# Altium footprint library PcbLib1.PcbLib: 69 footprints (part 3 of 5)
Each footprint in its own frame and in the unit in brackets; x right, y up, seen from the top. Pads: shape width x height; smd on the part's side, far side on the other; paste and mask are expansions set on the pad; w line width, h text height; cw(c..) or ccw(c..) is an arc to the next point about the centre after c.
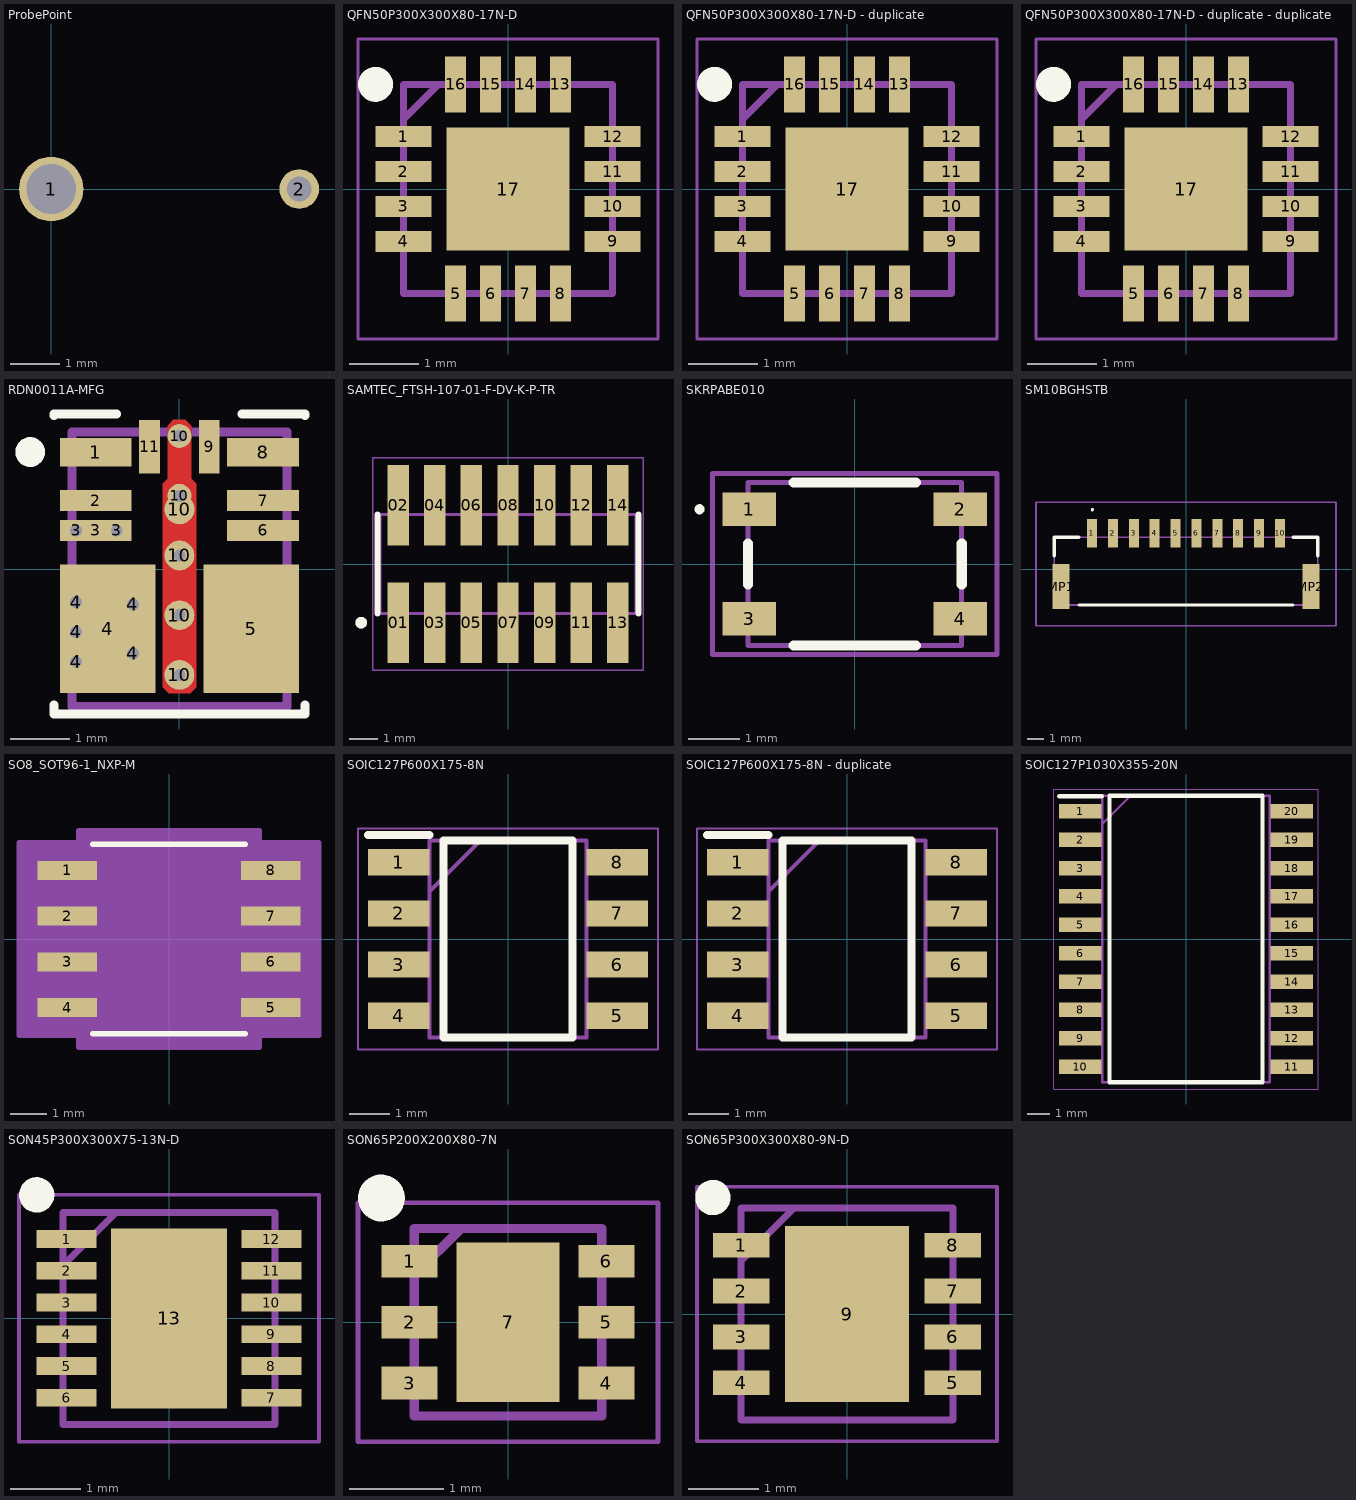
[diagram p2: the footprints below, top view; thin cyan lines are the x and y axes]

## PCBComponent_1 - duplicate - duplicate [mm]

## ProbePoint [mm]
pads (2):
  round 1.3 hole 1: 1(0,0)
  round 0.8 hole 0.5: 2(5,0)

## QFN50P300X300X80-17N-D [mm]
pads (17):
  rect 0.8x0.3 smd: 1(-1.5,0.75) 2(-1.5,0.25) 3(-1.5,-0.25) 4(-1.5,-0.75) 9(1.5,-0.75) 10(1.5,-0.25) 11(1.5,0.25) 12(1.5,0.75)
  rect 0.3x0.8 smd: 5(-0.75,-1.5) 6(-0.25,-1.5) 7(0.25,-1.5) 8(0.75,-1.5) 13(0.75,1.5) 14(0.25,1.5) 15(-0.25,1.5) 16(-0.75,1.5)
  rect 1.76x1.76 smd: 17(0,0)
Top Overlay:
  circle w0.25: c-1.9,1.5 r0.125
Mechanical 13:
  lines w0.1: -1.5,1 -1,1.5 ; -1.5,-1.5 1.5,-1.5 1.5,1.5 -1.5,1.5 -1.5,-1.5
Mechanical 15:
  lines w0.05: -2.15,-2.15 2.15,-2.15 2.15,2.15 -2.15,2.15 -2.15,-2.15
3D body "ADS7028IRTER.stp": height 0.8, standoff 0, extent -1.5,-1.5 1.5,1.5

## QFN50P300X300X80-17N-D - duplicate [mm]
pads (17):
  rect 0.8x0.3 smd: 1(-1.5,0.75) 2(-1.5,0.25) 3(-1.5,-0.25) 4(-1.5,-0.75) 9(1.5,-0.75) 10(1.5,-0.25) 11(1.5,0.25) 12(1.5,0.75)
  rect 0.3x0.8 smd: 5(-0.75,-1.5) 6(-0.25,-1.5) 7(0.25,-1.5) 8(0.75,-1.5) 13(0.75,1.5) 14(0.25,1.5) 15(-0.25,1.5) 16(-0.75,1.5)
  rect 1.76x1.76 smd mask+0.2: 17(0,0)
Top Overlay:
  circle w0.25: c-1.9,1.5 r0.125
Mechanical 13:
  lines w0.1: -1.5,1 -1,1.5 ; -1.5,-1.5 -1.5,1.5 1.5,1.5 1.5,-1.5 -1.5,-1.5
Mechanical 15:
  lines w0.05: -2.15,-2.15 -2.15,2.15 2.15,2.15 2.15,-2.15 -2.15,-2.15
3D body "ADS7138QRTERQ1.stp": height 0.8, standoff 0, extent -1.5,-1.5 1.5,1.5

## QFN50P300X300X80-17N-D - duplicate - duplicate [mm]
pads (17):
  rect 0.8x0.3 smd: 1(-1.5,0.75) 2(-1.5,0.25) 3(-1.5,-0.25) 4(-1.5,-0.75) 9(1.5,-0.75) 10(1.5,-0.25) 11(1.5,0.25) 12(1.5,0.75)
  rect 0.3x0.8 smd: 5(-0.75,-1.5) 6(-0.25,-1.5) 7(0.25,-1.5) 8(0.75,-1.5) 13(0.75,1.5) 14(0.25,1.5) 15(-0.25,1.5) 16(-0.75,1.5)
  rect 1.76x1.76 smd mask+0.2: 17(0,0)
Top Overlay:
  circle w0.25: c-1.9,1.5 r0.125
Mechanical 13:
  lines w0.1: -1.5,1 -1,1.5 ; -1.5,-1.5 1.5,-1.5 1.5,1.5 -1.5,1.5 -1.5,-1.5
Mechanical 15:
  lines w0.05: -2.15,-2.15 2.15,-2.15 2.15,2.15 -2.15,2.15 -2.15,-2.15
3D body "ADS7138QRTERQ1.stp": height 0.8, standoff 0, extent -1.5,-1.5 1.5,1.5

## RDN0011A-MFG [mm]
pads (24):
  rect 1.2x0.475 smd paste-0.587 mask-0.584: 1(-1.4,1.962) 8(1.4,1.962)
  rect 1.2x0.35 smd paste-0.587 mask-0.584: 2(-1.4,1.15) 3(-1.4,0.65) 6(1.4,0.65) 7(1.4,1.15)
  round 0.35 hole 0.2 paste-2539.97 mask-0.165: 3(-1.73,0.65) 3(-1.05,0.65)
  round 0.5 hole 0.2 paste-2539.97 mask-0.241: 4(-1.73,-1.55) 4(-1.73,-1.05) 4(-1.73,-0.55) 4(-0.78,-1.41) 4(-0.78,-0.59) 10(0,-1.77) 10(0,-0.77) 10(0,0.23)
  rect 1.6x2.15 smd paste-1.062 mask-1.067: 4(-1.2,-1) 5(1.2,-1)
  rect 0.35x0.9 smd paste-0.437 mask-0.432: 9(0.5,2.05) 11(-0.5,2.05)
  round 0.025 smd mask+0: 10(0,0.212)
  round 0.504 smd paste-0.239 mask-0.241: 10(0,1.005)
  round 0.4 hole 0.2 paste-2539.97 mask-0.191: 10(0,1.23) 10(0,2.23)
Top Layer:
  region: -0.2,1.515 -0.2,2.4 -0.1,2.5 0.1,2.5 0.2,2.4 0.2,1.515 0.24,1.475 0.28,1.435 0.28,-1.975 0.18,-2.075 -0.18,-2.075 -0.28,-1.975 -0.28,1.435 -0.24,1.475
Top Overlay:
  circle w0.25: c-2.5,1.962 r0.125
  lines w0.15: -2.1,-2.275 -2.1,-2.425 2.1,-2.425 2.1,-2.275 ; -2.1,2.575 -2.1,2.6 -1.05,2.6 ; 1.05,2.6 2.1,2.6 2.1,2.575
Top Paste:
  drawing of 23 lines, arcs and shapes, not listed
Top Solder:
  region: -0.15,0.974 -0.15,2.399 -0.1,2.449 0.1,2.449 0.15,2.399 0.15,0.974 0.1,0.924 -0.1,0.924
  region: -1.525,-2.025 -0.5,-2.025 -0.5,0.025 -1.525,0.025 -1.575,-0.025 -1.575,-0.125 -1.625,-0.175 -1.9,-0.175 -1.95,-0.225 -1.95,-0.375 -1.9,-0.425 -1.625,-0.425 -1.575,-0.475 -1.575,-0.625 -1.625,-0.675 -1.9,-0.675 -1.95,-0.725 -1.95,-0.875 -1.9,-0.925 -1.625,-0.925 -1.575,-0.975 -1.575,-1.125 -1.625,-1.175 -1.9,-1.175 -1.95,-1.225 -1.95,-1.375 -1.9,-1.425 -1.625,-1.425 -1.575,-1.475 -1.575,-1.625 -1.625,-1.675 -1.9,-1.675 -1.95,-1.725 -1.95,-1.875 -1.9,-1.925 -1.625,-1.925 -1.575,-1.975
  region: 1.525,-2.025 0.5,-2.025 0.5,0.025 1.525,0.025 1.575,-0.025 1.575,-0.125 1.625,-0.175 1.9,-0.175 1.95,-0.225 1.95,-0.375 1.9,-0.425 1.625,-0.425 1.575,-0.475 1.575,-0.625 1.625,-0.675 1.9,-0.675 1.95,-0.725 1.95,-0.875 1.9,-0.925 1.625,-0.925 1.575,-0.975 1.575,-1.125 1.625,-1.175 1.9,-1.175 1.95,-1.225 1.95,-1.375 1.9,-1.425 1.625,-1.425 1.575,-1.475 1.575,-1.625 1.625,-1.675 1.9,-1.675 1.95,-1.725 1.95,-1.875 1.9,-1.925 1.625,-1.925 1.575,-1.975
  region: -0.375,1.7 -0.425,1.65 -0.575,1.65 -0.625,1.7 -0.625,2.4 -0.575,2.45 -0.425,2.45 -0.375,2.4
  region: 0.625,1.7 0.575,1.65 0.425,1.65 0.375,1.7 0.375,2.4 0.425,2.45 0.575,2.45 0.625,2.4
  region: 0.85,0.575 0.85,0.725 0.9,0.775 1.9,0.775 1.95,0.725 1.95,0.575 1.9,0.525 0.9,0.525
  region: -1.9,0.775 -0.9,0.775 -0.85,0.725 -0.85,0.575 -0.9,0.525 -1.9,0.525 -1.95,0.575 -1.95,0.725
  region: -0.9,1.025 -1.9,1.025 -1.95,1.075 -1.95,1.225 -1.9,1.275 -0.9,1.275 -0.85,1.225 -0.85,1.075
  region: 0.9,1.025 0.85,1.075 0.85,1.225 0.9,1.275 1.9,1.275 1.95,1.225 1.95,1.075 1.9,1.025
  region: 1.9,2.15 1.95,2.1 1.95,1.824 1.9,1.774 0.9,1.774 0.85,1.824 0.85,2.1 0.9,2.15
  region: -1.95,1.824 -1.95,2.1 -1.9,2.15 -0.9,2.15 -0.85,2.1 -0.85,1.824 -0.9,1.774 -1.9,1.774
Mechanical 13:
  lines w0.15: -1.8,-2.3 -1.8,2.3 1.8,2.3 1.8,-2.3 -1.8,-2.3
3D body "TPSM33615FRDNR.stp": height 2.03, standoff 0.03, extent -1.814,-2.187 1.706,2.323

## SAMTEC_FTSH-107-01-F-DV-K-P-TR [mm]
pads (14):
  rect 0.74x2.79 smd: 01(-3.81,-2.035) 02(-3.81,2.035) 03(-2.54,-2.035) 04(-2.54,2.035) 05(-1.27,-2.035) 06(-1.27,2.035) 07(0,-2.035) 08(0,2.035) 09(1.27,-2.035) 10(1.27,2.035) 11(2.54,-2.035) 12(2.54,2.035) 13(3.81,-2.035) 14(3.81,2.035)
Top Overlay:
  circle w0.2: c-5.095,-2.035 r0.1
  lines w0.2: -4.53,-1.715 -4.53,1.715 ; 4.53,-1.715 4.53,1.715
Mechanical 13:
  circle w0.2: c-5.095,-2.035 r0.1
  lines w0.1: -4.445,-1.715 -4.445,1.715 ; -4.445,-1.715 4.445,-1.715 ; -4.445,-1.715 -4.445,1.715 ; -4.445,1.715 4.445,1.715 ; -4.445,1.715 4.445,1.715 ; 4.445,-1.715 4.445,1.715 ; 4.445,-1.715 4.445,1.715
Mechanical 15:
  lines w0.05: -4.695,-3.68 4.695,-3.68 4.695,3.68 -4.695,3.68 -4.695,-3.68
3D body "FTSH-107-01-F-DV-K-P-TR.step": height 6.96, standoff -0.03, extent -4.445,-4.318 4.445,3.048

## SKRPABE010 [mm]
pads (4):
  rect 1.05x0.65 smd: 1(-2.075,1.075) 2(2.075,1.075) 3(-2.075,-1.075) 4(2.075,-1.075)
Top Overlay:
  lines w0.1: -3.1,1.075 cw(c-3.05,1.075) -3,1.075 cw(c-3.05,1.075) -3.1,1.075
  lines w0.2: -2.1,-0.4 -2.1,0.4 ; -1.2,-1.6 1.2,-1.6 ; -1.2,1.6 1.2,1.6 ; 2.1,-0.4 2.1,0.4
Mechanical 13:
  lines w0.1: -2.1,-1.6 2.1,-1.6 2.1,1.6 -2.1,1.6 -2.1,-1.6
Mechanical 15:
  lines w0.1: -2.794,-1.778 2.794,-1.778 2.794,1.778 -2.794,1.778 -2.794,-1.778
3D body "SKRPABE010.stp": height 2.5, standoff 0, extent -2.3,-1.6 2.3,1.6

## SM10BGHSTB [mm]
pads (12):
  rect 0.6x1.7 smd: 1(-5.625,2.15) 2(-4.375,2.15) 3(-3.125,2.15) 4(-1.875,2.15) 5(-0.625,2.15) 6(0.625,2.15) 7(1.875,2.15) 8(3.125,2.15) 9(4.375,2.15) 10(5.625,2.15)
  rect 1x2.7 smd: MP1(-7.475,-1.05) MP2(7.475,-1.05)
Top Overlay:
  lines w0.1: -5.6,3.5 ccw(c-5.6,3.55) -5.6,3.6 ccw(c-5.6,3.55) -5.6,3.5
  lines w0.2: -7.875,0.8 -7.875,1.9 -6.4,1.9 ; -6.4,-2.15 6.4,-2.15 ; 6.4,1.9 7.875,1.9 7.875,0.8
Mechanical 13:
  lines w0.1: -7.875,-2.15 -7.875,1.9 7.875,1.9 7.875,-2.15 -7.875,-2.15
Mechanical 15:
  lines w0.1: -8.975,-3.4 -8.975,4 8.975,4 8.975,-3.4 -8.975,-3.4
3D body "SM10B-GHS-TB.stp": height 4.35, standoff 0, extent -7.875,-2.3 7.875,2.94

## SO8_SOT96-1_NXP-M [mil]
pads (8):
  rect 65.5x21 smd paste+0 mask+0: 1(-111.25,75) 2(-111.25,25) 3(-111.25,-25) 4(-111.25,-75) 5(111.25,-75) 6(111.25,-25) 7(111.25,25) 8(111.25,75)
Top Overlay:
  lines w6: -83.5,-103.5 83.5,-103.5 ; -83.5,103.5 83.5,103.5
Mechanical 13:
  lines w0: -12,98.5 ccw(c0,98.5) 12,98.5
  lines w1: -122,-84.5 -122,-65.5 -78.5,-65.5 -78.5,-84.5 -122,-84.5 ; -122,-34.5 -122,-15.5 -78.5,-15.5 -78.5,-34.5 -122,-34.5 ; -122,15.5 -122,34.5 -78.5,34.5 -78.5,15.5 -122,15.5 ; -122,65.5 -122,84.5 -78.5,84.5 -78.5,65.5 -122,65.5 ; -78.5,-98.5 78.5,-98.5 78.5,98.5 -78.5,98.5 -78.5,-98.5 ; 78.5,-84.5 78.5,-65.5 122,-65.5 122,-84.5 78.5,-84.5 ; 78.5,-34.5 78.5,-15.5 122,-15.5 122,-34.5 78.5,-34.5 ; 78.5,15.5 78.5,34.5 122,34.5 122,15.5 78.5,15.5 ; 78.5,65.5 78.5,84.5 122,84.5 122,65.5 78.5,65.5
  text "*" at -76,45.5 h50
Mechanical 15:
  region: -98.5,-105.5 -164,-105.5 -164,105.5 -98.5,105.5 -98.5,118.5 98.5,118.5 98.5,105.5 164,105.5 164,-105.5 98.5,-105.5 98.5,-118.5 -98.5,-118.5
  lines w6: -164,-105.5 -164,105.5 -98.5,105.5 -98.5,118.5 98.5,118.5 98.5,105.5 164,105.5 164,-105.5 98.5,-105.5 98.5,-118.5 -98.5,-118.5 -98.5,-105.5 -164,-105.5
3D body "SO8_SOT96-1_NXP.step": height 69.09, standoff 0, extent -122.01,-98.5 122.01,98.5

## SOIC127P600X175-8N [mm]
pads (8):
  rect 1.525x0.65 smd: 1(-2.712,1.905) 2(-2.712,0.635) 3(-2.712,-0.635) 4(-2.712,-1.905) 5(2.712,-1.905) 6(2.712,-0.635) 7(2.712,0.635) 8(2.712,1.905)
Top Overlay:
  lines w0.2: -3.475,2.58 -1.95,2.58 ; -1.6,-2.45 1.6,-2.45 1.6,2.45 -1.6,2.45 -1.6,-2.45
Mechanical 13:
  lines w0.1: -1.95,1.18 -0.68,2.45 ; -1.95,-2.45 1.95,-2.45 1.95,2.45 -1.95,2.45 -1.95,-2.45
Mechanical 15:
  lines w0.05: -3.725,-2.75 3.725,-2.75 3.725,2.75 -3.725,2.75 -3.725,-2.75
3D body "TCAN332DR.stp": height 1.63, standoff 0, extent -3.011,-2.451 3.011,2.451

## SOIC127P600X175-8N - duplicate [mm]
pads (8):
  rect 1.525x0.65 smd: 1(-2.712,1.905) 2(-2.712,0.635) 3(-2.712,-0.635) 4(-2.712,-1.905) 5(2.712,-1.905) 6(2.712,-0.635) 7(2.712,0.635) 8(2.712,1.905)
Top Overlay:
  lines w0.2: -3.475,2.58 -1.95,2.58 ; -1.6,-2.45 -1.6,2.45 1.6,2.45 1.6,-2.45 -1.6,-2.45
Mechanical 13:
  lines w0.1: -1.95,1.18 -0.68,2.45 ; -1.95,-2.45 -1.95,2.45 1.95,2.45 1.95,-2.45 -1.95,-2.45
Mechanical 15:
  lines w0.05: -3.725,-2.75 -3.725,2.75 3.725,2.75 3.725,-2.75 -3.725,-2.75
3D body "SN65HVD78DR.stp": height 1.63, standoff 0, extent -3.011,-2.451 3.011,2.451

## SOIC127P1030X355-20N [mm]
pads (20):
  rect 1.9x0.65 smd: 1(-4.725,5.715) 2(-4.725,4.445) 3(-4.725,3.175) 4(-4.725,1.905) 5(-4.725,0.635) 6(-4.725,-0.635) 7(-4.725,-1.905) 8(-4.725,-3.175) 9(-4.725,-4.445) 10(-4.725,-5.715) 11(4.725,-5.715) 12(4.725,-4.445) 13(4.725,-3.175) 14(4.725,-1.905) 15(4.725,-0.635) 16(4.725,0.635) 17(4.725,1.905) 18(4.725,3.175) 19(4.725,4.445) 20(4.725,5.715)
Top Overlay:
  lines w0.2: -5.675,6.39 -3.775,6.39 ; -3.425,-6.415 -3.425,6.415 3.425,6.415 3.425,-6.415 -3.425,-6.415
Mechanical 13:
  lines w0.1: -3.75,5.145 -2.48,6.415 ; -3.75,-6.415 -3.75,6.415 3.75,6.415 3.75,-6.415 -3.75,-6.415
Mechanical 15:
  lines w0.05: -5.925,-6.715 -5.925,6.715 5.925,6.715 5.925,-6.715 -5.925,-6.715
3D body "ISOW1044BDFMR.stp": height 3.55, standoff 0, extent -5.15,-6.477 5.15,6.353

## SON45P300X300X75-13N-D [mm]
pads (13):
  rect 0.85x0.25 smd: 1(-1.45,1.125) 2(-1.45,0.675) 3(-1.45,0.225) 4(-1.45,-0.225) 5(-1.45,-0.675) 6(-1.45,-1.125) 7(1.45,-1.125) 8(1.45,-0.675) 9(1.45,-0.225) 10(1.45,0.225) 11(1.45,0.675) 12(1.45,1.125)
  rect 1.65x2.55 smd: 13(0,0)
Top Overlay:
  circle w0.25: c-1.875,1.75 r0.125
Mechanical 13:
  lines w0.1: -1.5,0.75 -0.75,1.5 ; -1.5,-1.5 -1.5,1.5 1.5,1.5 1.5,-1.5 -1.5,-1.5
Mechanical 15:
  lines w0.05: -2.125,-1.75 -2.125,1.75 2.125,1.75 2.125,-1.75 -2.125,-1.75
3D body "FT234XD-R.stp": height 0.75, standoff 0, extent -1.55,-1.5 1.55,1.5

## SON65P200X200X80-7N [mm]
pads (7):
  rect 0.6x0.35 smd: 1(-1.05,0.65) 2(-1.05,0) 3(-1.05,-0.65) 4(1.05,-0.65) 5(1.05,0) 6(1.05,0.65)
  rect 1.1x1.7 smd: 7(0,0)
Top Overlay:
  circle w0.25: c-1.35,1.325 r0.125
Mechanical 13:
  lines w0.1: -1,0.5 -0.5,1 ; -1,-1 1,-1 1,1 -1,1 -1,-1
Mechanical 15:
  lines w0.05: -1.6,-1.275 1.6,-1.275 1.6,1.275 -1.6,1.275 -1.6,-1.275
3D body "LDH40PUR.stp": height 0.8, standoff 0, extent -1.05,-1 1.05,1

## SON65P300X300X80-9N-D [mm]
pads (9):
  rect 0.8x0.35 smd: 1(-1.5,0.975) 2(-1.5,0.325) 3(-1.5,-0.325) 4(-1.5,-0.975) 5(1.5,-0.975) 6(1.5,-0.325) 7(1.5,0.325) 8(1.5,0.975)
  rect 1.75x2.5 smd: 9(0,0)
Top Overlay:
  circle w0.25: c-1.9,1.65 r0.125
Mechanical 13:
  lines w0.1: -1.5,0.75 -0.75,1.5 ; -1.5,-1.5 -1.5,1.5 1.5,1.5 1.5,-1.5 -1.5,-1.5
Mechanical 15:
  lines w0.05: -2.125,-1.8 -2.125,1.8 2.125,1.8 2.125,-1.8 -2.125,-1.8
3D body "TPS7A7401DSDR.stp": height 0.8, standoff 0, extent -1.55,-1.54 1.55,1.54